# Altium schematic symbol library TI - ADC.SchLib: 2197 symbols (part 5 of 130) (continued)
## ADC104S021QIMMX/NOPB
designator U?
4 Channel, 50 to 200 kSPS, 10-Bit ADC, -40 to 85 degC, 10-pin SOP (DGS10), Green (RoHS & no Sb/Br); Manufacturer: Texas Instruments; PartNumber: ADC104S021QIMMX/NOPB; # Input Channels: 4; Analog Voltage AV/DD(Max)(V): 5.25; Analog Voltage AV/DD(Min)(V): 2.7; Architecture: SAR; ENOB(Bits): 9.9; INL(Max)(+/-LSB): 0.3; Interface: Serial SPI, QSPI, Microwire (Serial I/O); Resolution(Bits): 10; Sample Rate(max)(SPS): 200k; SFDR(dB): 82; SINAD(dB): 61.8; SubFamily: Precision ADC (<=10MSPS); DatasheetVersion: SNAS278H; PackageVersion: 4073272/C, 02/2004; PackageReference: DGS10; PackageDescription: 10-Pin Plastic Small Outline, Body 3 x 3 mm, Pitch 0.5 mm; Supplier 1: Digi-Key; Supplier Part Number 1: ADS7887SDBVR-ND; Supplier 2: Mouser; Supplier Part Number 2: 595-ADS7887SDBVR; Digital Supply(Max)(V): 5.25; Digital Supply(Min)(V): 2.7; Eco-Plan: Green (RoHS & no Sb/Br); SNR(dB): 61.8; Mounting Technology: Surface Mount; Code_JEDEC: MO-153; ComponentLink1Description: Manufacturer URL; ComponentLink1URL: http://www.ti.com/; ComponentLink2Description: Datasheet; ComponentLink2URL: http://www.ti.com/lit/ds/symlink/adc104s021q-q1.pdf; ComponentLink3Description: Package Specification; ComponentLink3URL: http://www.ti.com/lit/ml/mpds035b/mpds035b.pdf
footprint TI-DGS10_N (SOP, 10-Leads, Body 3x3mm, Pitch 0.5mm, IPC Medium Density)
footprint TI-DGS10_L (SOP, 10-Leads, Body 3x3mm, Pitch 0.5mm, IPC High Density)
footprint TI-DGS10_M (SOP, 10-Leads, Body 3x3mm, Pitch 0.5mm, IPC Low Density)
pins: 1 ~{CS} (in) "Chip select. On the falling edge of C\S\, a conversion process begins. Conversions continue as long as C\S\ is held low.", 2 VA (power) "Positive supply pin. This pin should be connected to a quiet +2.7V to +5.25V source and bypassed to GND with a 1 uF capacitor and a 0.1 uF monolithic capacitor located within 1 cm of the power pin.", 3 GND (power) "The ground return for supply and signals.", 4 IN4 (in) "Analog inputs. These signals can range from 0V to VA.", 5 IN3 (in) "Analog inputs. These signals can range from 0V to VA.", 6 IN2 (in) "Analog inputs. These signals can range from 0V to VA.", 7 IN1 (in) "Analog inputs. These signals can range from 0V to VA.", 8 DIN (in) "Digital data input. The ADC104S021/ADC104S021Q's Control Register is loaded through this pin on rising edges of the SCLK pin.", 9 DOUT (hiz) "Digital data output. The output samples are clocked out of this pin on falling edges of the SCLK pin.", 10 SCLK (in) "Digital clock input. This clock directly controls the conversion and readout processes."

## ADC121S101QIMF/NOPB
designator U?
Automotive Single Channel, 0.5 to 1 MSPS, 12-Bit ADC, -40 to 125 degC, 6-pin SOT23 (DBV6), Green (RoHS & no Sb/Br); Manufacturer: Texas Instruments; PartNumber: ADC121S101QIMF/NOPB; # Input Channels: 1; Analog Voltage AV/DD(Max)(V): 5.25; Analog Voltage AV/DD(Min)(V): 2.7; Architecture: SAR; ENOB(Bits): 11.6; Interface: Serial SPI, QSPI, Microwire (Serial I/O); Resolution(Bits): 12; Sample Rate(max)(SPS): 1M; SFDR(dB): 82; SINAD(dB): 72; SNR(dB): 72.5; SubFamily: Precision ADC (<=10MSPS); DatasheetVersion: SNAS304F; PackageVersion: 4073253-5/K, 03/2006; PackageReference: DBV6; PackageDescription: 6-Pin Plastic Small Outline, Body 1.6 x 2.9 mm, Pitch 0.95 mm; Supplier 1: Digi-Key; Supplier Part Number 1: 296-18266-2-ND; Supplier 2: Digi-Key; Supplier Part Number 2: 296-18266-1-ND; Supplier 3: Digi-Key; Supplier Part Number 3: 296-18266-6-ND; Supplier 4: Farnell; Supplier Part Number 4: 1575133; Supplier 5: Newark; Supplier Part Number 5: 43K9040; Supplier 6: Mouser; Supplier Part Number 6: 595-ADS7887SDBVT; Digital Supply(Max)(V): 5.25; Digital Supply(Min)(V): 2.7; Eco-Plan: Green (RoHS & no Sb/Br); INL(Max)(+/-LSB): 1; Mounting Technology: Surface Mount; Code_JEDEC: MO-178; ComponentLink1Description: Manufacturer URL; ComponentLink1URL: http://www.ti.com/; ComponentLink2Description: Datasheet; ComponentLink2URL: http://www.ti.com/lit/ds/symlink/adc121s101-q1.pdf; ComponentLink3Description: Package Specification; ComponentLink3URL: http://www.ti.com/litv/pdf/mpds026h
footprint TI-DBV6_N (SOT23, 6-Leads, Body 2.9x1.6mm, Pitch 0.95mm, IPC Medium Density)
footprint TI-DBV6_L (SOT23, 6-Leads, Body 2.9x1.6mm, Pitch 0.95mm, IPC High Density)
footprint TI-DBV6_M (SOT23, 6-Leads, Body 2.9x1.6mm, Pitch 0.95mm, IPC Low Density)
pins: 1 VA (power) "Positive supply pin. This pin should be connected to a quiet +2.7V to +5.25V source and bypassed to GND with a 1 uF capacitor and a 0.1 uF monolithic capacitor located within 1 cm of the power pin.", 2 GND (power) "The ground return for the supply and signals.", 3 VIN (in) "Analog input. This signal can range from 0V to VA.", 4 SCLK (in) "Digital clock input. This clock directly controls the conversion and readout processes.", 5 SDATA (hiz) "Digital data output. The output samples are clocked out of this pin on falling edges of the SCLK pin.", 6 ~{CS} (in) "Chip select. On the falling edge of C\S\, a conversion process begins."

## ADC121S101QIMFX/NOPB
designator U?
Automotive Single Channel, 0.5 to 1 MSPS, 12-Bit ADC, -40 to 125 degC, 6-pin SOT23 (DBV6), Green (RoHS & no Sb/Br); Manufacturer: Texas Instruments; PartNumber: ADC121S101QIMFX/NOPB; # Input Channels: 1; Analog Voltage AV/DD(Max)(V): 5.25; Analog Voltage AV/DD(Min)(V): 2.7; Architecture: SAR; ENOB(Bits): 11.6; Interface: Serial SPI, QSPI, Microwire (Serial I/O); Resolution(Bits): 12; Sample Rate(max)(SPS): 1M; SFDR(dB): 82; SINAD(dB): 72; SNR(dB): 72.5; SubFamily: Precision ADC (<=10MSPS); DatasheetVersion: SNAS304F; PackageVersion: 4073253-5/K, 03/2006; PackageReference: DBV6; PackageDescription: 6-Pin Plastic Small Outline, Body 1.6 x 2.9 mm, Pitch 0.95 mm; Supplier 1: Mouser; Supplier Part Number 1: N/A; Digital Supply(Max)(V): 5.25; Digital Supply(Min)(V): 2.7; Eco-Plan: Green (RoHS & no Sb/Br); INL(Max)(+/-LSB): 1; Mounting Technology: Surface Mount; Code_JEDEC: MO-178; ComponentLink1Description: Manufacturer URL; ComponentLink1URL: http://www.ti.com/; ComponentLink2Description: Datasheet; ComponentLink2URL: http://www.ti.com/lit/ds/symlink/adc121s101-q1.pdf; ComponentLink3Description: Package Specification; ComponentLink3URL: http://www.ti.com/litv/pdf/mpds026h
footprint TI-DBV6_N (SOT23, 6-Leads, Body 2.9x1.6mm, Pitch 0.95mm, IPC Medium Density)
footprint TI-DBV6_L (SOT23, 6-Leads, Body 2.9x1.6mm, Pitch 0.95mm, IPC High Density)
footprint TI-DBV6_M (SOT23, 6-Leads, Body 2.9x1.6mm, Pitch 0.95mm, IPC Low Density)
pins: 1 VA (power) "Positive supply pin. This pin should be connected to a quiet +2.7V to +5.25V source and bypassed to GND with a 1 uF capacitor and a 0.1 uF monolithic capacitor located within 1 cm of the power pin.", 2 GND (power) "The ground return for the supply and signals.", 3 VIN (in) "Analog input. This signal can range from 0V to VA.", 4 SCLK (in) "Digital clock input. This clock directly controls the conversion and readout processes.", 5 SDATA (hiz) "Digital data output. The output samples are clocked out of this pin on falling edges of the SCLK pin.", 6 ~{CS} (in) "Chip select. On the falling edge of C\S\, a conversion process begins."

## ADC122S051QIMM/NOPB
designator U?
2 Channel, 200 to 500 kSPS 12-Bit ADC, -40 to 85 degC, 8-pin SOP (DGK8), Green (RoHS & no Sb/Br); Manufacturer: Texas Instruments; PartNumber: ADC122S051QIMM/NOPB; # Input Channels: 2; Analog Voltage AV/DD(Max)(V): 5.25; Analog Voltage AV/DD(Min)(V): 2.7; Architecture: SAR; ENOB(Bits): 11.7; INL(Max)(+/-LSB): 1.1; Interface: Serial SPI, QSPI, Microwire (Serial I/O); Resolution(Bits): 12; Sample Rate(max)(SPS): 500k; SFDR(dB): 86; SINAD(dB): 72; SNR(dB): 72.5; SubFamily: Precision ADC (<=10MSPS); DatasheetVersion: SNAS257E; PackageVersion: 4073329/E, 05/2006; PackageReference: DGK8; PackageDescription: 8-Pin Thin Small Outline, Body 3 x 3 mm, Pitch 0.65 mm; Supplier 1: Digi-Key; Supplier Part Number 1: ADS7888SDBVR-ND; Supplier 2: Newark; Supplier Part Number 2: 43K9043; Supplier 3: Mouser; Supplier Part Number 3: 595-ADS7888SDBVR; Digital Supply(Max)(V): 5.25; Digital Supply(Min)(V): 2.7; Eco-Plan: Green (RoHS & no Sb/Br); Mounting Technology: Surface Mount; Code_JEDEC: MO-187; ComponentLink1Description: Manufacturer URL; ComponentLink1URL: http://www.ti.com/; ComponentLink2Description: Datasheet; ComponentLink2URL: http://www.ti.com/lit/ds/symlink/adc122s051q-q1.pdf; ComponentLink3Description: Package Specification; ComponentLink3URL: http://www.ti.com/litv/pdf/mpds028d
footprint TI-DGK8_N (SOP, 8-Leads, Body 3x3mm, Pitch 0.65mm, IPC Medium Density)
footprint TI-DGK8_L (SOP, 8-Leads, Body 3x3mm, Pitch 0.65mm, IPC High Density)
footprint TI-DGK8_M (SOP, 8-Leads, Body 3x3mm, Pitch 0.65mm, IPC Low Density)
pins: 1 ~{CS} (in) "Chip select. On the falling edge of C\S\, a conversion process begins. Conversions continue as long as C\S\ is held low.", 2 VA (power) "Positive supply pin. This pin should be connected to a quiet +2.7V to +5.25V source and bypassed to GND with a 1 uF capacitor and a 0.1 uF monolithic capacitor located within 1 cm of the power pin.", 3 GND (power) "The ground return for the die.", 4 IN2 (in) "Analog inputs. These signals can range from 0V to VA.", 5 IN1 (in) "Analog inputs. These signals can range from 0V to VA.", 6 DIN (in) "Digital data input. The ADC122S051/ADC122S051Q's Control Register is loaded through this pin on rising edges of the SCLK pin.", 7 DOUT (hiz) "Digital data output. The output samples are clocked out of this pin on falling edges of the SCLK pin.", 8 SCLK (in) "Digital clock input. This clock directly controls the conversion and readout processes."

## ADC122S051QIMMX/NOPB
designator U?
2 Channel, 200 to 500 kSPS 12-Bit ADC, -40 to 85 degC, 8-pin SOP (DGK8), Green (RoHS & no Sb/Br); Manufacturer: Texas Instruments; PartNumber: ADC122S051QIMMX/NOPB; # Input Channels: 2; Analog Voltage AV/DD(Max)(V): 5.25; Analog Voltage AV/DD(Min)(V): 2.7; Architecture: SAR; ENOB(Bits): 11.7; INL(Max)(+/-LSB): 1.1; Interface: Serial SPI, QSPI, Microwire (Serial I/O); Resolution(Bits): 12; Sample Rate(max)(SPS): 500k; SFDR(dB): 86; SINAD(dB): 72; SNR(dB): 72.5; SubFamily: Precision ADC (<=10MSPS); DatasheetVersion: SNAS257E; PackageVersion: 4073329/E, 05/2006; PackageReference: DGK8; PackageDescription: 8-Pin Thin Small Outline, Body 3 x 3 mm, Pitch 0.65 mm; Supplier 1: Digi-Key; Supplier Part Number 1: 296-18268-2-ND; Supplier 2: Digi-Key; Supplier Part Number 2: 296-18268-1-ND; Supplier 3: Digi-Key; Supplier Part Number 3: 296-18268-6-ND; Supplier 4: Newark; Supplier Part Number 4: 43K9044; Supplier 5: Mouser; Supplier Part Number 5: 595-ADS7888SDBVT; Digital Supply(Max)(V): 5.25; Digital Supply(Min)(V): 2.7; Eco-Plan: Green (RoHS & no Sb/Br); Mounting Technology: Surface Mount; Code_JEDEC: MO-187; ComponentLink1Description: Manufacturer URL; ComponentLink1URL: http://www.ti.com/; ComponentLink2Description: Datasheet; ComponentLink2URL: http://www.ti.com/lit/ds/symlink/adc122s051q-q1.pdf; ComponentLink3Description: Package Specification; ComponentLink3URL: http://www.ti.com/litv/pdf/mpds028d
footprint TI-DGK8_N (SOP, 8-Leads, Body 3x3mm, Pitch 0.65mm, IPC Medium Density)
footprint TI-DGK8_L (SOP, 8-Leads, Body 3x3mm, Pitch 0.65mm, IPC High Density)
footprint TI-DGK8_M (SOP, 8-Leads, Body 3x3mm, Pitch 0.65mm, IPC Low Density)
pins: 1 ~{CS} (in) "Chip select. On the falling edge of C\S\, a conversion process begins. Conversions continue as long as C\S\ is held low.", 2 VA (power) "Positive supply pin. This pin should be connected to a quiet +2.7V to +5.25V source and bypassed to GND with a 1 uF capacitor and a 0.1 uF monolithic capacitor located within 1 cm of the power pin.", 3 GND (power) "The ground return for the die.", 4 IN2 (in) "Analog inputs. These signals can range from 0V to VA.", 5 IN1 (in) "Analog inputs. These signals can range from 0V to VA.", 6 DIN (in) "Digital data input. The ADC122S051/ADC122S051Q's Control Register is loaded through this pin on rising edges of the SCLK pin.", 7 DOUT (hiz) "Digital data output. The output samples are clocked out of this pin on falling edges of the SCLK pin.", 8 SCLK (in) "Digital clock input. This clock directly controls the conversion and readout processes."

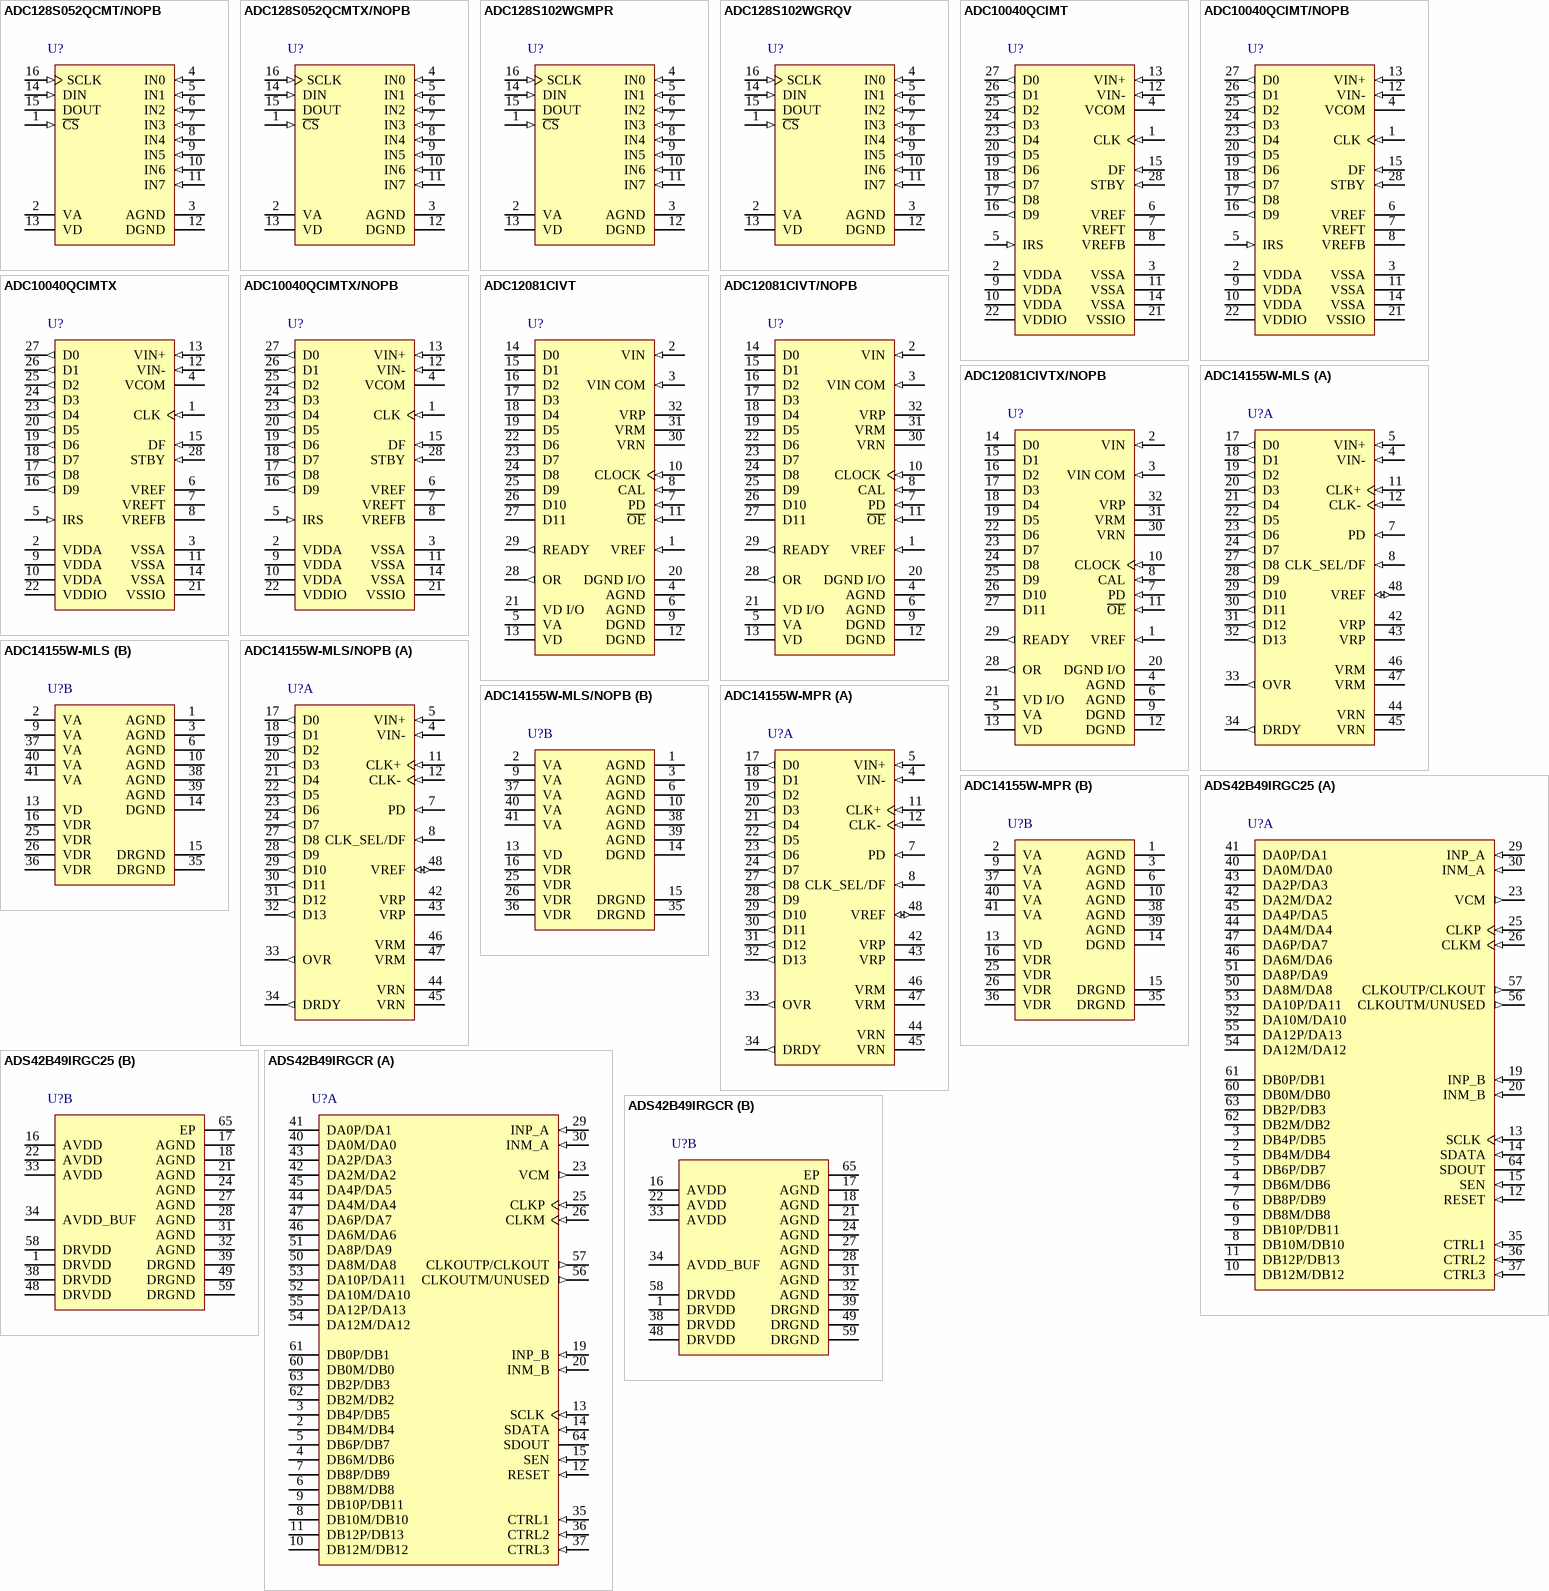
[diagram p2: symbols ADC128S052QCMT/NOPB to ADS42B49IRGCR]

## ADC128S052QCMT/NOPB
designator U?
8-Channel, 200 to 500 kSPS, 12-Bit ADC, -40 to 125 degC, 16-pin SOP (PW16), Green (RoHS & no Sb/Br); Manufacturer: Texas Instruments; PartNumber: ADC128S052QCMT/NOPB; # Input Channels: 8; Analog Voltage AV/DD(Max)(V): 5.25; Analog Voltage AV/DD(Min)(V): 2.7; Architecture: SAR; ENOB(Bits): 11.8; INL(Max)(+/-LSB): 1; Interface: Serial SPI, QSPI, Microwire (Serial I/O); Resolution(Bits): 12; Sample Rate(max)(SPS): 500k; SFDR(dB): 92; SINAD(dB): 73; SubFamily: Precision ADC (<=10MSPS); DatasheetVersion: SNAS333D; PackageVersion: 4040064-4/G, 02/2011; PackageReference: PW16; PackageDescription: 16-Pin Plastic Small Outline, Body 5 x 4.4 mm, Pitch 0.65 mm; Supplier 1: Mouser; Supplier Part Number 1: N/A; Digital Supply(Max)(V): 5.25; Digital Supply(Min)(V): 2.7; Eco-Plan: Green (RoHS & no Sb/Br); SNR(dB): 73; Mounting Technology: Surface Mount; Code_JEDEC: MO-153; ComponentLink1Description: Manufacturer URL; ComponentLink1URL: http://www.ti.com/; ComponentLink2Description: Datasheet; ComponentLink2URL: http://www.ti.com/lit/ds/symlink/adc128s052-q1.pdf; ComponentLink3Description: Package Specification; ComponentLink3URL: http://www.ti.com/lit/ml/mpds361/mpds361.pdf
footprint TI-PW16_N (SOP, 16-Leads, Body 5x4.4mm, Pitch 0.65mm, IPC Medium Density)
footprint TI-PW16_L (SOP, 16-Leads, Body 5x4.4mm, Pitch 0.65mm, IPC High Density)
footprint TI-PW16_M (SOP, 16-Leads, Body 5x4.4mm, Pitch 0.65mm, IPC Low Density)
pins: 1 ~{CS} (in), 2 VA (power), 3 AGND (power), 4 IN0 (in), 5 IN1 (in), 6 IN2 (in), 7 IN3 (in), 8 IN4 (in), 9 IN5 (in), 10 IN6 (in), 11 IN7 (in), 12 DGND (power), 13 VD (power), 14 DIN (in), 15 DOUT (hiz), 16 SCLK (in)

## ADC128S052QCMTX/NOPB
designator U?
8-Channel, 200 to 500 kSPS, 12-Bit ADC, -40 to 125 degC, 16-pin SOP (PW16), Green (RoHS & no Sb/Br); Manufacturer: Texas Instruments; PartNumber: ADC128S052QCMTX/NOPB; # Input Channels: 8; Analog Voltage AV/DD(Max)(V): 5.25; Analog Voltage AV/DD(Min)(V): 2.7; Architecture: SAR; ENOB(Bits): 11.8; INL(Max)(+/-LSB): 1; Interface: Serial SPI, QSPI, Microwire (Serial I/O); Resolution(Bits): 12; Sample Rate(max)(SPS): 500k; SFDR(dB): 92; SINAD(dB): 73; SubFamily: Precision ADC (<=10MSPS); DatasheetVersion: SNAS333D; PackageVersion: 4040064-4/G, 02/2011; PackageReference: PW16; PackageDescription: 16-Pin Plastic Small Outline, Body 5 x 4.4 mm, Pitch 0.65 mm; Supplier 1: Digi-Key; Supplier Part Number 1: ADS7868IDBVR-ND; Supplier 2: Mouser; Supplier Part Number 2: 595-ADS7868IDBVR; Digital Supply(Max)(V): 5.25; Digital Supply(Min)(V): 2.7; Eco-Plan: Green (RoHS & no Sb/Br); SNR(dB): 73; Mounting Technology: Surface Mount; Code_JEDEC: MO-153; ComponentLink1Description: Manufacturer URL; ComponentLink1URL: http://www.ti.com/; ComponentLink2Description: Datasheet; ComponentLink2URL: http://www.ti.com/lit/ds/symlink/adc128s052-q1.pdf; ComponentLink3Description: Package Specification; ComponentLink3URL: http://www.ti.com/lit/ml/mpds361/mpds361.pdf
footprint TI-PW16_N (SOP, 16-Leads, Body 5x4.4mm, Pitch 0.65mm, IPC Medium Density)
footprint TI-PW16_L (SOP, 16-Leads, Body 5x4.4mm, Pitch 0.65mm, IPC High Density)
footprint TI-PW16_M (SOP, 16-Leads, Body 5x4.4mm, Pitch 0.65mm, IPC Low Density)
pins: 1 ~{CS} (in), 2 VA (power), 3 AGND (power), 4 IN0 (in), 5 IN1 (in), 6 IN2 (in), 7 IN3 (in), 8 IN4 (in), 9 IN5 (in), 10 IN6 (in), 11 IN7 (in), 12 DGND (power), 13 VD (power), 14 DIN (in), 15 DOUT (hiz), 16 SCLK (in)

## ADC128S102WGMPR
designator U?
8-Channel, 0.05 to 1 MSPS, 12-Bit ADC, 25 degC, 16-pin CFP (NAC16); Manufacturer: Texas Instruments; PartNumber: ADC128S102WGMPR; # Input Channels: 8; Analog Voltage AV/DD(Max)(V): 5.25; Analog Voltage AV/DD(Min)(V): 2.7; Architecture: SAR; ENOB(Bits): 11.6; INL(Max)(+/-LSB): 1.1; Interface: Serial SPI, QSPI, Microwire (Serial I/O); Resolution(Bits): 12; Sample Rate(max)(SPS): 1M; SFDR(dB): 91; SINAD(dB): 72; SubFamily: Precision ADC (<=10MSPS); DatasheetVersion: SNAS411M; PackageVersion: Rev. G, 02/2013; PackageReference: NAC16; PackageDescription: 16-Pin Ceramic, Metal Flat Pack, Body 9.91 x 6.35 mm, Pitch 1.27 mm; Supplier 1: Digi-Key; Supplier Part Number 1: ADS7868IDBVRG4-ND; Supplier 2: Mouser; Supplier Part Number 2: 595-ADS7868IDBVRG4; Digital Supply(Max)(V): 5.25; Digital Supply(Min)(V): 2.7; SNR(dB): 72; Mounting Technology: Surface Mount; ComponentLink1Description: Manufacturer URL; ComponentLink1URL: http://www.ti.com/; ComponentLink2Description: Datasheet; ComponentLink2URL: http://www.ti.com/lit/ds/symlink/adc128s102qml-sp.pdf; ComponentLink3Description: Package Specification; ComponentLink3URL: http://www.ti.com/litv/pdf/mclg025
footprint TI-NAC16_N (CFP, 16-Leads, Body 9.91x6.35mm, Pitch 1.27mm, IPC Medium Density)
footprint TI-NAC16_L (CFP, 16-Leads, Body 9.91x6.35mm, Pitch 1.27mm, IPC High Density)
footprint TI-NAC16_M (CFP, 16-Leads, Body 9.91x6.35mm, Pitch 1.27mm, IPC Low Density)
pins: 1 ~{CS} (in), 2 VA (power), 3 AGND (power), 4 IN0 (in), 5 IN1 (in), 6 IN2 (in), 7 IN3 (in), 8 IN4 (in), 9 IN5 (in), 10 IN6 (in), 11 IN7 (in), 12 DGND (power), 13 VD (power), 14 DIN (in), 15 DOUT (hiz), 16 SCLK (in)

## ADC128S102WGRQV
designator U?
8-Channel, 0.05 to 1 MSPS, 12-Bit ADC, -55 to 125 degC, 16-pin CFP (NAC16); Manufacturer: Texas Instruments; PartNumber: ADC128S102WGRQV; # Input Channels: 8; Analog Voltage AV/DD(Max)(V): 5.25; Analog Voltage AV/DD(Min)(V): 2.7; Architecture: SAR; ENOB(Bits): 11.6; INL(Max)(+/-LSB): 1.1; Interface: Serial SPI, QSPI, Microwire (Serial I/O); Resolution(Bits): 12; Sample Rate(max)(SPS): 1M; SFDR(dB): 91; SINAD(dB): 72; SubFamily: Precision ADC (<=10MSPS); DatasheetVersion: SNAS411M; PackageVersion: Rev. G, 02/2013; PackageReference: NAC16; PackageDescription: 16-Pin Ceramic, Metal Flat Pack, Body 9.91 x 6.35 mm, Pitch 1.27 mm; Supplier 1: Digi-Key; Supplier Part Number 1: 296-18218-2-ND; Supplier 2: Digi-Key; Supplier Part Number 2: 296-18218-1-ND; Supplier 3: Digi-Key; Supplier Part Number 3: 296-18218-6-ND; Supplier 4: Mouser; Supplier Part Number 4: 595-ADS7868IDBVT; Digital Supply(Max)(V): 5.25; Digital Supply(Min)(V): 2.7; SNR(dB): 72; Mounting Technology: Surface Mount; ComponentLink1Description: Manufacturer URL; ComponentLink1URL: http://www.ti.com/; ComponentLink2Description: Datasheet; ComponentLink2URL: http://www.ti.com/lit/ds/symlink/adc128s102qml-sp.pdf; ComponentLink3Description: Package Specification; ComponentLink3URL: http://www.ti.com/litv/pdf/mclg025
footprint TI-NAC16_N (CFP, 16-Leads, Body 9.91x6.35mm, Pitch 1.27mm, IPC Medium Density)
footprint TI-NAC16_L (CFP, 16-Leads, Body 9.91x6.35mm, Pitch 1.27mm, IPC High Density)
footprint TI-NAC16_M (CFP, 16-Leads, Body 9.91x6.35mm, Pitch 1.27mm, IPC Low Density)
pins: 1 ~{CS} (in), 2 VA (power), 3 AGND (power), 4 IN0 (in), 5 IN1 (in), 6 IN2 (in), 7 IN3 (in), 8 IN4 (in), 9 IN5 (in), 10 IN6 (in), 11 IN7 (in), 12 DGND (power), 13 VD (power), 14 DIN (in), 15 DOUT (hiz), 16 SCLK (in)

## ADC10040QCIMT
designator U?
10-Bit, 40 MSPS, 3 V, 55.5 mW ADC, -40 to 85 degC, 28-pin SOP (PW28); Manufacturer: Texas Instruments; PartNumber: ADC10040QCIMT; # Input Channels: 1; Analog Voltage AV/DD(Max)(V): 3.6; Analog Voltage AV/DD(Min)(V): 2.7; Architecture: Pipeline; Digital Supply(Min)(V): 2.5; ENOB(Bits): 9.6; Resolution(Bits): 10; Sample Rate(max)(SPS): 40M; SFDR(dB): 80; SINAD(dB): 59.4; SNR(dB): 59.5; SubFamily: High Speed ADC (>10MSPS); DatasheetVersion: SNAS224M; PackageVersion: 4040064-7/G, 02/2011; PackageReference: PW28; PackageDescription: 28-Pin Plastic Small Outline, Body 9.7 x 4.4 mm, Pitch 0.65 mm; Supplier 1: Digi-Key; Supplier Part Number 1: ADS7868IDBVTG4-ND; Supplier 2: Farnell; Supplier Part Number 2: 1329579; Supplier 3: Newark; Supplier Part Number 3: 61M4826; Supplier 4: Mouser; Supplier Part Number 4: 595-ADS7868IDBVTG4; Digital Supply(Max)(V): 3.6; INL(Max)(+/-LSB): 1; Mounting Technology: Surface Mount; Code_JEDEC: MO-153; ComponentLink1Description: Manufacturer URL; ComponentLink1URL: http://www.ti.com/; ComponentLink2Description: Datasheet; ComponentLink2URL: http://www.ti.com/lit/ds/symlink/adc10040-q1.pdf; ComponentLink3Description: Package Specification; ComponentLink3URL: http://www.ti.com/litv/pdf/mpds364
footprint TI-PW28_N (SOP, 28-Leads, Body 9.7x4.4mm, Pitch 0.65mm, IPC Medium Density)
footprint TI-PW28_L (SOP, 28-Leads, Body 9.7x4.4mm, Pitch 0.65mm, IPC High Density)
footprint TI-PW28_M (SOP, 28-Leads, Body 9.7x4.4mm, Pitch 0.65mm, IPC Low Density)
pins: 1 CLK (in) "Digital clock input. The range of frequencies for this input is 20 MHz to 40 MHz. The input is sampled on the rising edge of this input.", 2 VDDA (power) "Positive analog supply pins. These pins should be connected to a quiet 3,0V source and bypassed to analog ground with a 0.1 uf monolithic capacitor located within 1 cm of these pins. A 4.7 uF capacitor should also be used in (See Datasheet)", 3 VSSA (power) "Ground return for the analog supply.", 4 VCOM "These pins are high impedance reference bypass pins only. Connect a 0.1 uF capacitor from each of these pins to VSSA. These pins should not be loaded. VCOM may be used to set the input common mode voltage VCM.", 5 IRS (in) "IRS = “VDDA” 2.0 VP-P input range. IRS = “VSSA” 1.5 VP-P input range. IRS = “Floating” 1.0 VP-P input range. If using both VIN+ and VIN- pins, (or differential mode), then the peak-to-peak voltage re(See Datasheet)", 6 VREF "Reference Voltage. This device provides an internal 1.2V reference. This pin should be bypassed to VSSA with a 0.1 uF monolithic capacitor. VREF is 1.20V nominal. This pin may be driven by a 1.20V external reference if (See Datasheet)", 7 VREFT "These pins are high impedance reference bypass pins only. Connect a 0.1 uF capacitor from each of these pins to VSSA. These pins should not be loaded. VCOM may be used to set the input common mode voltage VCM.", 8 VREFB "These pins are high impedance reference bypass pins only. Connect a 0.1 uF capacitor from each of these pins to VSSA. These pins should not be loaded. VCOM may be used to set the input common mode voltage VCM.", 9 VDDA (power) "Positive analog supply pins. These pins should be connected to a quiet 3,0V source and bypassed to analog ground with a 0.1 uf monolithic capacitor located within 1 cm of these pins. A 4.7 uF capacitor should also be used in (See Datasheet)", 10 VDDA (power) "Positive analog supply pins. These pins should be connected to a quiet 3,0V source and bypassed to analog ground with a 0.1 uf monolithic capacitor located within 1 cm of these pins. A 4.7 uF capacitor should also be used in (See Datasheet)", 11 VSSA (power) "Ground return for the analog supply.", 12 VIN- (in) "Inverting analog input signal. With a 1.2V reference the full-scale input signal level is a differential 1.0 VP-P. This pin may be tied to VCOM (pin 4) for single-ended operation.", 13 VIN+ (in) "Non-inverting analog input signal. With a 1.2V reference the fullscale input signal level is a differential 1.0 VP-P.", 14 VSSA (power) "Ground return for the analog supply.", 15 DF (in) "DF = “1” Two’s Complement DF = “0” Offset Binary", 16 D9 (out) "Digital output data. D0 is the LSB and D9 is the MSB of the binary output word.", 17 D8 (out) "Digital output data. D0 is the LSB and D9 is the MSB of the binary output word.", 18 D7 (out) "Digital output data. D0 is the LSB and D9 is the MSB of the binary output word.", 19 D6 (out) "Digital output data. D0 is the LSB and D9 is the MSB of the binary output word.", 20 D5 (out) "Digital output data. D0 is the LSB and D9 is the MSB of the binary output word.", 21 VSSIO (power) "The ground return for the digital supply for the output drivers. This pin should be connected to the ground plane, but not near the analog circuitry.", 22 VDDIO (power) "Positive digital supply pins for the ADC10040’s output drivers. This pin should be bypassed to digital ground with a 0.1 uF monolithic capacitor located within 1 cm of this pin. A 4.7 uF capacitor should also be used i(See Datasheet)", 23 D4 (out) "Digital output data. D0 is the LSB and D9 is the MSB of the binary output word.", 24 D3 (out) "Digital output data. D0 is the LSB and D9 is the MSB of the binary output word.", 25 D2 (out) "Digital output data. D0 is the LSB and D9 is the MSB of the binary output word.", 26 D1 (out) "Digital output data. D0 is the LSB and D9 is the MSB of the binary output word.", 27 D0 (out) "Digital output data. D0 is the LSB and D9 is the MSB of the binary output word.", 28 STBY (in) "This is the standby pin. When high, this pin sets the converter into standby mode. When this pin is low, the converter is in active mode."

## ADC10040QCIMT/NOPB
designator U?
10-Bit, 40 MSPS, 3 V, 55.5 mW ADC, -40 to 85 degC, 28-pin SOP (PW28), Green (RoHS & no Sb/Br); Manufacturer: Texas Instruments; PartNumber: ADC10040QCIMT/NOPB; # Input Channels: 1; Analog Voltage AV/DD(Max)(V): 3.6; Analog Voltage AV/DD(Min)(V): 2.7; Architecture: Pipeline; Digital Supply(Min)(V): 2.5; ENOB(Bits): 9.6; Resolution(Bits): 10; Sample Rate(max)(SPS): 40M; SFDR(dB): 80; SINAD(dB): 59.4; SNR(dB): 59.5; SubFamily: High Speed ADC (>10MSPS); DatasheetVersion: SNAS224M; PackageVersion: 4040064-7/G, 02/2011; PackageReference: PW28; PackageDescription: 28-Pin Plastic Small Outline, Body 9.7 x 4.4 mm, Pitch 0.65 mm; Supplier 1: Digi-Key; Supplier Part Number 1: ADS7867IDBVR-ND; Supplier 2: Newark; Supplier Part Number 2: 43K2916; Supplier 3: Mouser; Supplier Part Number 3: 595-ADS7867IDBVR; Digital Supply(Max)(V): 3.6; Eco-Plan: Green (RoHS & no Sb/Br); INL(Max)(+/-LSB): 1; Mounting Technology: Surface Mount; Code_JEDEC: MO-153; ComponentLink1Description: Manufacturer URL; ComponentLink1URL: http://www.ti.com/; ComponentLink2Description: Datasheet; ComponentLink2URL: http://www.ti.com/lit/ds/symlink/adc10040-q1.pdf; ComponentLink3Description: Package Specification; ComponentLink3URL: http://www.ti.com/litv/pdf/mpds364
footprint TI-PW28_N (SOP, 28-Leads, Body 9.7x4.4mm, Pitch 0.65mm, IPC Medium Density)
footprint TI-PW28_L (SOP, 28-Leads, Body 9.7x4.4mm, Pitch 0.65mm, IPC High Density)
footprint TI-PW28_M (SOP, 28-Leads, Body 9.7x4.4mm, Pitch 0.65mm, IPC Low Density)
pins: 1 CLK (in) "Digital clock input. The range of frequencies for this input is 20 MHz to 40 MHz. The input is sampled on the rising edge of this input.", 2 VDDA (power) "Positive analog supply pins. These pins should be connected to a quiet 3,0V source and bypassed to analog ground with a 0.1 uf monolithic capacitor located within 1 cm of these pins. A 4.7 uF capacitor should also be used in (See Datasheet)", 3 VSSA (power) "Ground return for the analog supply.", 4 VCOM "These pins are high impedance reference bypass pins only. Connect a 0.1 uF capacitor from each of these pins to VSSA. These pins should not be loaded. VCOM may be used to set the input common mode voltage VCM.", 5 IRS (in) "IRS = “VDDA” 2.0 VP-P input range. IRS = “VSSA” 1.5 VP-P input range. IRS = “Floating” 1.0 VP-P input range. If using both VIN+ and VIN- pins, (or differential mode), then the peak-to-peak voltage re(See Datasheet)", 6 VREF "Reference Voltage. This device provides an internal 1.2V reference. This pin should be bypassed to VSSA with a 0.1 uF monolithic capacitor. VREF is 1.20V nominal. This pin may be driven by a 1.20V external reference if (See Datasheet)", 7 VREFT "These pins are high impedance reference bypass pins only. Connect a 0.1 uF capacitor from each of these pins to VSSA. These pins should not be loaded. VCOM may be used to set the input common mode voltage VCM.", 8 VREFB "These pins are high impedance reference bypass pins only. Connect a 0.1 uF capacitor from each of these pins to VSSA. These pins should not be loaded. VCOM may be used to set the input common mode voltage VCM.", 9 VDDA (power) "Positive analog supply pins. These pins should be connected to a quiet 3,0V source and bypassed to analog ground with a 0.1 uf monolithic capacitor located within 1 cm of these pins. A 4.7 uF capacitor should also be used in (See Datasheet)", 10 VDDA (power) "Positive analog supply pins. These pins should be connected to a quiet 3,0V source and bypassed to analog ground with a 0.1 uf monolithic capacitor located within 1 cm of these pins. A 4.7 uF capacitor should also be used in (See Datasheet)", 11 VSSA (power) "Ground return for the analog supply.", 12 VIN- (in) "Inverting analog input signal. With a 1.2V reference the full-scale input signal level is a differential 1.0 VP-P. This pin may be tied to VCOM (pin 4) for single-ended operation.", 13 VIN+ (in) "Non-inverting analog input signal. With a 1.2V reference the fullscale input signal level is a differential 1.0 VP-P.", 14 VSSA (power) "Ground return for the analog supply.", 15 DF (in) "DF = “1” Two’s Complement DF = “0” Offset Binary", 16 D9 (out) "Digital output data. D0 is the LSB and D9 is the MSB of the binary output word.", 17 D8 (out) "Digital output data. D0 is the LSB and D9 is the MSB of the binary output word.", 18 D7 (out) "Digital output data. D0 is the LSB and D9 is the MSB of the binary output word.", 19 D6 (out) "Digital output data. D0 is the LSB and D9 is the MSB of the binary output word.", 20 D5 (out) "Digital output data. D0 is the LSB and D9 is the MSB of the binary output word.", 21 VSSIO (power) "The ground return for the digital supply for the output drivers. This pin should be connected to the ground plane, but not near the analog circuitry.", 22 VDDIO (power) "Positive digital supply pins for the ADC10040’s output drivers. This pin should be bypassed to digital ground with a 0.1 uF monolithic capacitor located within 1 cm of this pin. A 4.7 uF capacitor should also be used i(See Datasheet)", 23 D4 (out) "Digital output data. D0 is the LSB and D9 is the MSB of the binary output word.", 24 D3 (out) "Digital output data. D0 is the LSB and D9 is the MSB of the binary output word.", 25 D2 (out) "Digital output data. D0 is the LSB and D9 is the MSB of the binary output word.", 26 D1 (out) "Digital output data. D0 is the LSB and D9 is the MSB of the binary output word.", 27 D0 (out) "Digital output data. D0 is the LSB and D9 is the MSB of the binary output word.", 28 STBY (in) "This is the standby pin. When high, this pin sets the converter into standby mode. When this pin is low, the converter is in active mode."